# Altium footprint library std-th.PcbLib: 245 footprints (part 3 of 16)
Each footprint in its own frame and in the unit in brackets; x right, y up, seen from the top. Pads: shape width x height; smd on the part's side, far side on the other; paste and mask are expansions set on the pad; w line width, h text height; cw(c..) or ccw(c..) is an arc to the next point about the centre after c.
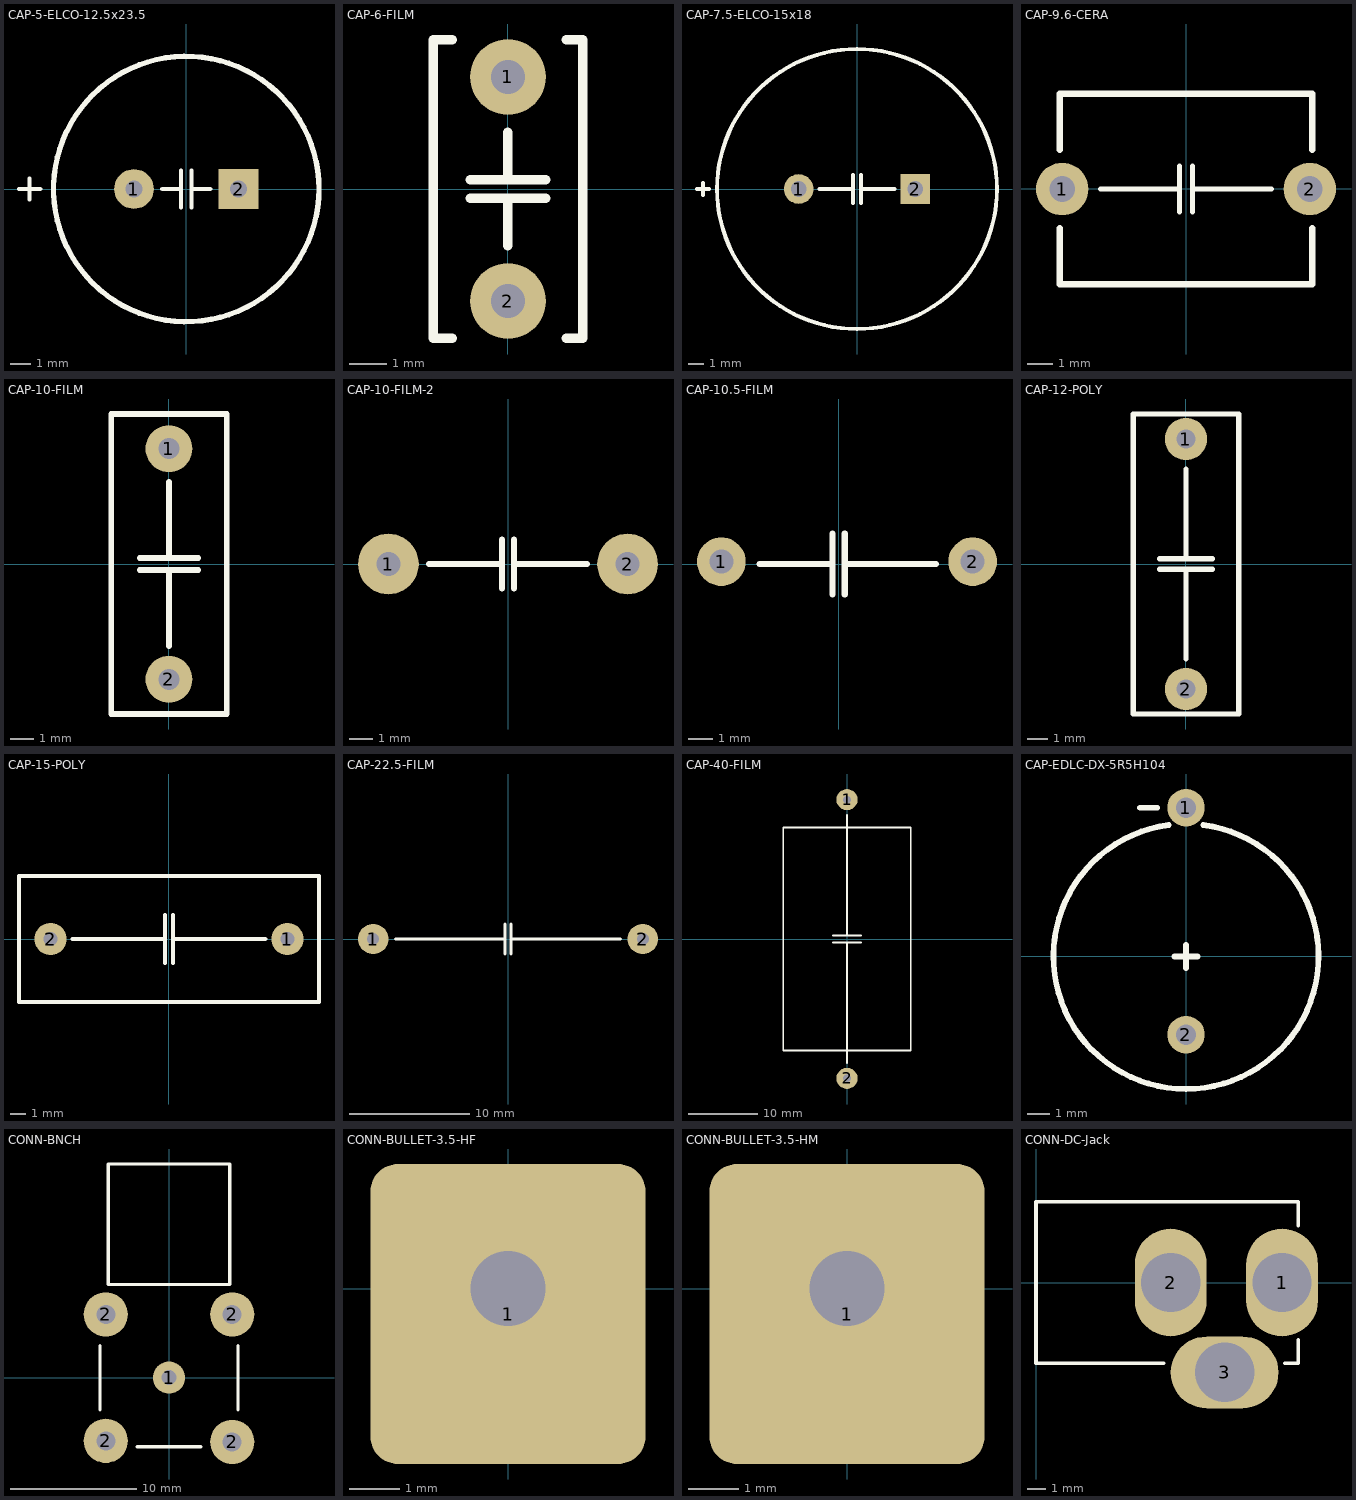
[diagram p2: the footprints below, top view; thin cyan lines are the x and y axes]

## CAP-5-ELCO-12.5x23.5 [mm] "Capacitor, Electrolytic, Radial, 12.5 mm body 5 mm leads"
height 23.5
pads (2):
  round 1.905 hole 0.8: 1(-2.5,0)
  rect 1.905x1.905 hole 0.8: 2(2.5,0)
Top Overlay:
  circle w0.254: c0,0 r6.35
  lines w0.203: -8.001,0 -6.985,0 ; -7.493,-0.508 -7.493,0.508 ; -1.143,0 -0.254,0 ; -0.254,-0.889 -0.254,0.889 ; 0.254,-0.889 0.254,0.889 ; 0.254,0 1.143,0
3D body: height 24.99, standoff -19, extent -6.223,-6.25 6.277,6.25

## CAP-6-FILM [mil] "Capacitor, film, 6 mm pitch"
height 314.96
pads (2):
  round 80 hole 35.43: 1(0,118.11) 2(0,-118.11)
Top Overlay:
  lines w10: -58.73,-157.48 -78.73,-157.48 -78.73,157.48 -58.73,157.48 ; -40,-10 40,-10 ; -40,10 40,10 ; 0,-60 0,-10 ; 0,10 0,60 ; 61.27,-157.48 78.75,-157.48 78.75,157.48 61.27,157.48
3D body: height 467.87, standoff -201.16, extent -78.73,-157.48 78.75,157.48

## CAP-7.5-ELCO-15x18 [mm] "Capacitor, electrolytic, 15x18mm, 7.5 mm pitch"
height 15
pads (2):
  round 1.905 hole 1: 1(-3.75,0)
  rect 1.905x1.905 hole 1: 2(3.75,0)
Top Overlay:
  circle w0.254: c0,0 r9
  lines w0.254: -10.287,0 -9.525,0 ; -9.906,-0.381 -9.906,0.381 ; -2.413,0 -0.381,0 ; -0.254,-0.889 -0.254,0.889 ; 0.254,-0.889 0.254,0.889 ; 0.381,0 2.413,0
3D body: height 15, standoff -2.5, extent -9,-9 9,9

## CAP-9.6-CERA [mil] "Capacitor, 2 leads, 9.6 mm pitch"
height 287.4
pads (2):
  round 80 hole 39.37: 1(-188.98,-0.04) 2(188.93,0)
Top Overlay:
  lines w8: -130,0 -45,0 -10,0 ; -10,-35 -10,35 ; 10,-35 10,35 ; 10,0 130,0
  lines w10: -192.92,-60 -192.92,-145.67 192.91,-145.67 192.91,-60 ; -192.92,60 -192.92,145.67 192.91,145.67 192.91,60
3D body: height 275.59, standoff -129.92, extent -198.79,-145.67 198.75,145.67

## CAP-10-FILM [mil] "Capacitor, film, 2 leads, 10 mm pitch"
height 393.7
pads (2):
  round 80 hole 35.43: 1(0,196.85) 2(0,-196.85)
Top Overlay:
  lines w10: -50,-10 50,-10 ; -50,10 50,10 ; 0,-140 0,-10 ; 0,10 0,140 ; -98.42,-255.9 -98.42,255.91 98.44,255.91 98.44,-255.9 -98.42,-255.9
3D body: height 508.64, standoff -219.7, extent -98.42,-255.9 98.44,255.91

## CAP-10-FILM-2 [mm] "Capacitor, 10 mm pitch, film"
height 8
pads (2):
  round 2.54 hole 1: 1(-5,0) 2(5,0)
Top Overlay:
  lines w0.254: -3.302,0 -0.254,0 ; -0.254,-1.016 -0.254,1.016 ; 0.254,-1.016 0.254,1.016 ; 0.254,0 3.302,0
3D body: height 17.9, standoff -4.23, extent -6.06,-3.75 5.94,3.75

## CAP-10.5-FILM [mil] "Capacitor, 10.5 mm pitch, film"
height 314.96
pads (2):
  round 80 hole 39.37: 1(-193.01,3.86) 2(220.37,3.86)
Top Overlay:
  lines w10: -130,0 -10,0 ; -10,-50 -10,50 ; 10,-50 10,50 ; 10,0 160,0
3D body: height 641.59, standoff -161.98, extent -232.13,-112.28 260,120

## CAP-12-POLY [mil] "Capacitor, Polymer, 2 leads, 12 mm pitch"
height 393.7
pads (2):
  round 80 hole 35.43: 1(0,237.5) 2(0,-237.5)
Top Overlay:
  lines w10: -50,-10 50,-10 ; -50,10 50,10 ; 0,-180 0,-10 ; 0,10 0,180 ; -99.99,-285 100.01,-285 100.01,285 -99.99,285 -99.99,-285
3D body: height 519.22, standoff -1230.78, extent -99.99,-285 100.01,285

## CAP-15-POLY [mil] "Capacitor, 2 leads, Polymer, 15 mm pitch"
height 393.7
pads (2):
  round 80 hole 35.43: 1(295.28,0) 2(-295.28,0)
Top Overlay:
  lines w10: -240,0 -10,0 ; -10,-60 -10,60 ; 10,-60 10,60 ; 10,0 240,0 ; -374.01,-157.48 374.03,-157.48 374.03,157.48 -374.01,157.48 -374.01,-157.48
3D body: height 627.91, standoff -159.49, extent -374.01,-157.48 374.03,157.48

## CAP-22.5-FILM [mm] "Capacitor, 22.5 mm pitch, film"
height 12
pads (2):
  round 2.54 hole 1: 1(-11.25,0) 2(11.25,0)
Top Overlay:
  lines w0.254: -9.398,0 -0.254,0 ; -0.254,-1.27 -0.254,1.27 ; 0.254,-1.27 0.254,1.27 ; 0.254,0 9.398,0
3D body: height 20.5, standoff -3, extent -13,-4.65 13,4.65

## CAP-40-FILM [mil] "Capacitor, 2 leads, 40 mm pitch, high voltage"
height 787.4
pads (2):
  round 120 hole 43.31: 1(0,787.4) 2(0,-787.4)
Top Overlay:
  lines w10: -80,-20.02 79.77,-20.02 ; -80,20 79.77,20 ; -0.11,-20.02 -0.11,-50.03 -0.11,-150.08 0,-150.08 0,-700 ; -0.11,20 -0.11,50.01 -0.11,150.06 0,150.06 0,700 ; 360,-630 360,629.92 -360,629.92 -360,630 -360,510 -360,-629.92 360,-629.92
3D body: height 708.66, standoff -236.22, extent -354.32,-807.08 354.34,807.09

## CAP-EDLC-DX-5R5H104 [mil] "Supercapacitor, DX-5R5H104"
height 196.85
pads (2):
  round 65 hole 35.43 paste+0 mask+0: 1(0,257.87) 2(0,-135.83)
Top Overlay:
  lines w10: -80,257.87 -50,257.87 ; -29.75,228.07 ccw(c0,0) 29.75,228.07 ; -20,0 20,0 ; 0,-20 0,20
3D body: height 34.06, standoff -233.66, extent -226.12,-226.31 226.38,261.82

## CONN-BNCH [mm] "Connector, BNC, right angle"
pads (5):
  round 2.54 hole 1.2: 1(0,0)
  round 3.5 hole 1.5: 2(-5,-5) 2(-5,5) 2(5,-5.08) 2(5,5)
Top Overlay:
  lines w0.254: -5.461,-2.54 -5.461,2.54 ; -2.54,-5.461 2.54,-5.461 ; 5.461,-2.54 5.461,2.54 ; -4.8,7.366 -4.8,16.9 4.8,16.9 4.8,7.366 -4.8,7.366
3D body: height 19.92, standoff -2.73, extent -5.5,-5.5 5.5,16.9

## CONN-BULLET-3.5-HF [mm] "Bullet plug, 3.5mm, female, right angle"
height 4
pads (2):
  rrect20% 5.5x6 smd: 1(0,-0.508)
  rrect50% 0x0 hole 1.5: 1(0,0)
3D body: height 4.79, standoff -0.01, extent -2.412,-10.418 2.369,1.532

## CONN-BULLET-3.5-HM [mm] "Bullet plug, 3.5mm, male, right angle"
height 4
pads (2):
  rrect20% 5.5x6 smd: 1(0,-0.508)
  rrect50% 0x0 hole 1.5: 1(0,0)
3D body: height 4.69, standoff -0.01, extent -2.35,-11.176 2.35,1.524

## CONN-DC-Jack [mm] "DC Power Jack, 2.5mm, KLD Series, PCB Mount"
height 4.7
pads (3):
  oval 4x6 hole 3.3: 1(13.7,0) 2(7.5,0)
  oval 6x4 hole 3.3: 3(10.5,-5)
Top Overlay:
  lines w0.2: 7.112,-4.5 0,-4.5 0,4.5 14.6,4.5 14.6,3.175 ; 13.843,-4.5 14.6,-4.5 14.6,-3.175
Mechanical 1:
  text "Mech 2 - Clearance, move to internal plane if present" at 0.286,5.066 h0.3
  text "Mech 1 - Slot cut-out" at 0.286,5.566 h0.3
  text "Assign keep-out area to slot" at 0.286,6.566 h0.3
  text "Alert PCB fab to slot details" at 0.286,6.066 h0.3
3D body: height 11, standoff -3.5, extent 0,-4.9 14.5,4.5